# Altium schematic symbol library jlcpcb_2025_04_capacitors_extended_1206.schlib: 2503 symbols (part 4 of 14) (continued)
## C1206C104K5RACAUTO
designator C?  Capacitance: 100nF  (hidden comment: *)
Capacitor, Ceramic (MLCC), 100nF, ±10%, 50V, X7R, ±10%, SMD 1206; Manufacturer: KEMET; Manufacturer Part Number: C1206C104K5RACAUTO; Package Size: 1206; JLCPCB Basic Part: No; JLCPCB Part Number: C2178599; Supplier 1: LCSC; Category: Capacitors - MLCC; Supplier Part Number 1: C2178599; Tolerance: ±10%; Voltage Rating: 50V; Temperature Coefficient: X7R; RoHS: Yes; ComponentLink1Description: Datasheet; ComponentLink1URL: https://wmsc.lcsc.com/wmsc/upload/file/pdf/v2/lcsc/2304140030_KEMET-C1206C104K5RACAUTO_C2178599.pdf; ComponentLink2Description: JLCPCB Part URL; ComponentLink2URL: https://jlcpcb.com/partdetail/C2178599; ComponentLink3Description: LCSC Part URL; ComponentLink3URL: https://lcsc.com/product-detail/Multilayer-Ceramic-Capacitors-MLCC---SMD-SMT_KEMET-KEMET-C1206C104K5RACAUTO_C2178599.html
footprint CAP-1206 (1206 (3216M) Capacitor)
pins: 1, 2

## C1206C104KARAC7800
designator C?  Capacitance: 100nF  (hidden comment: *)
Capacitor, Ceramic (MLCC), 100nF, ±10%, 250V, X7R, ±10%, SMD 1206; Manufacturer: KEMET; Manufacturer Part Number: C1206C104KARAC7800; Package Size: 1206; JLCPCB Basic Part: No; JLCPCB Part Number: C141185; Supplier 1: LCSC; Category: Capacitors - MLCC; Supplier Part Number 1: C141185; Tolerance: ±10%; Voltage Rating: 250V; Temperature Coefficient: X7R; RoHS: Yes; ComponentLink1Description: Datasheet; ComponentLink1URL: https://wmsc.lcsc.com/wmsc/upload/file/pdf/v2/lcsc/2304140030_KEMET-C1206C104KARAC7800_C141185.pdf; ComponentLink2Description: JLCPCB Part URL; ComponentLink2URL: https://jlcpcb.com/partdetail/C141185; ComponentLink3Description: LCSC Part URL; ComponentLink3URL: https://lcsc.com/product-detail/Multilayer-Ceramic-Capacitors-MLCC---SMD-SMT_KEMET-KEMET-C1206C104KARAC7800_C141185.html
footprint CAP-1206 (1206 (3216M) Capacitor)
pins: 1, 2

## C1206C105K1RACAUTO
designator C?  Capacitance: 1uF  (hidden comment: *)
Capacitor, Ceramic (MLCC), 1uF, ±10%, 100V, X7R, ±10%, SMD 1206; Manufacturer: KEMET; Manufacturer Part Number: C1206C105K1RACAUTO; Package Size: 1206; JLCPCB Basic Part: No; JLCPCB Part Number: C696372; Supplier 1: LCSC; Category: Capacitors - MLCC; Supplier Part Number 1: C696372; Tolerance: ±10%; Voltage Rating: 100V; Temperature Coefficient: X7R; RoHS: Yes; ComponentLink1Description: Datasheet; ComponentLink1URL: https://wmsc.lcsc.com/wmsc/upload/file/pdf/v2/lcsc/2401181721_KEMET-C1206C105K1RACAUTO_C696372.pdf; ComponentLink2Description: JLCPCB Part URL; ComponentLink2URL: https://jlcpcb.com/partdetail/C696372; ComponentLink3Description: LCSC Part URL; ComponentLink3URL: https://lcsc.com/product-detail/Multilayer-Ceramic-Capacitors-MLCC---SMD-SMT_KEMET-KEMET-C1206C105K1RACAUTO_C696372.html
footprint CAP-1206 (1206 (3216M) Capacitor)
pins: 1, 2

## C1206C105K4RAC7800
designator C?  Capacitance: 1uF  (hidden comment: *)
Capacitor, Ceramic (MLCC), 1uF, ±10%, 16V, X7R, ±10%, SMD 1206; Manufacturer: KEMET; Manufacturer Part Number: C1206C105K4RAC7800; Package Size: 1206; JLCPCB Basic Part: No; JLCPCB Part Number: C696374; Supplier 1: LCSC; Category: Capacitors - MLCC; Supplier Part Number 1: C696374; Tolerance: ±10%; Voltage Rating: 16V; Temperature Coefficient: X7R; RoHS: Yes; ComponentLink1Description: Datasheet; ComponentLink1URL: https://wmsc.lcsc.com/wmsc/upload/file/pdf/v2/lcsc/2304140030_KEMET-C1206C105K4RAC7800_C696374.pdf; ComponentLink2Description: JLCPCB Part URL; ComponentLink2URL: https://jlcpcb.com/partdetail/C696374; ComponentLink3Description: LCSC Part URL; ComponentLink3URL: https://lcsc.com/product-detail/Multilayer-Ceramic-Capacitors-MLCC---SMD-SMT_KEMET-KEMET-C1206C105K4RAC7800_C696374.html
footprint CAP-1206 (1206 (3216M) Capacitor)
pins: 1, 2

## C1206C105K4RACTU
designator C?  Capacitance: 1uF  (hidden comment: *)
Capacitor, Ceramic (MLCC), 1uF, ±10%, 16V, X7R, ±10%, SMD 1206; Manufacturer: KEMET; Manufacturer Part Number: C1206C105K4RACTU; Package Size: 1206; JLCPCB Basic Part: No; JLCPCB Part Number: C2167419; Supplier 1: LCSC; Category: Capacitors - MLCC; Supplier Part Number 1: C2167419; Tolerance: ±10%; Voltage Rating: 16V; Temperature Coefficient: X7R; RoHS: Yes; ComponentLink1Description: Datasheet; ComponentLink1URL: https://wmsc.lcsc.com/wmsc/upload/file/pdf/v2/lcsc/2304140030_KEMET-C1206C105K4RACTU_C2167419.pdf; ComponentLink2Description: JLCPCB Part URL; ComponentLink2URL: https://jlcpcb.com/partdetail/C2167419; ComponentLink3Description: LCSC Part URL; ComponentLink3URL: https://lcsc.com/product-detail/Multilayer-Ceramic-Capacitors-MLCC---SMD-SMT_KEMET-KEMET-C1206C105K4RACTU_C2167419.html
footprint CAP-1206 (1206 (3216M) Capacitor)
pins: 1, 2

## C1206C105M4RAC7800
designator C?  Capacitance: 1uF  (hidden comment: *)
Capacitor, Ceramic (MLCC), 1uF, ±20%, 16V, X7R, ±20%, SMD 1206; Manufacturer: KEMET; Manufacturer Part Number: C1206C105M4RAC7800; Package Size: 1206; JLCPCB Basic Part: No; JLCPCB Part Number: C141188; Supplier 1: LCSC; Category: Capacitors - MLCC; Supplier Part Number 1: C141188; Tolerance: ±20%; Voltage Rating: 16V; Temperature Coefficient: X7R; RoHS: Yes; ComponentLink1Description: Datasheet; ComponentLink1URL: https://wmsc.lcsc.com/wmsc/upload/file/pdf/v2/lcsc/2304140030_KEMET-C1206C105M4RAC7800_C141188.pdf; ComponentLink2Description: JLCPCB Part URL; ComponentLink2URL: https://jlcpcb.com/partdetail/C141188; ComponentLink3Description: LCSC Part URL; ComponentLink3URL: https://lcsc.com/product-detail/Multilayer-Ceramic-Capacitors-MLCC---SMD-SMT_KEMET-KEMET-C1206C105M4RAC7800_C141188.html
footprint CAP-1206 (1206 (3216M) Capacitor)
pins: 1, 2

## C1206C106J3RACAUTO
designator C?  Capacitance: 10uF  (hidden comment: *)
Capacitor, Ceramic (MLCC), 10uF, ±5%, 25V, X7R, ±5%, SMD 1206; Manufacturer: KEMET; Manufacturer Part Number: C1206C106J3RACAUTO; Package Size: 1206; JLCPCB Basic Part: No; JLCPCB Part Number: C696375; Supplier 1: LCSC; Category: Capacitors - MLCC; Supplier Part Number 1: C696375; Tolerance: ±5%; Voltage Rating: 25V; Temperature Coefficient: X7R; RoHS: Yes; ComponentLink1Description: Datasheet; ComponentLink1URL: https://wmsc.lcsc.com/wmsc/upload/file/pdf/v2/lcsc/2304140030_KEMET-C1206C106J3RACAUTO_C696375.pdf; ComponentLink2Description: JLCPCB Part URL; ComponentLink2URL: https://jlcpcb.com/partdetail/C696375; ComponentLink3Description: LCSC Part URL; ComponentLink3URL: https://lcsc.com/product-detail/Multilayer-Ceramic-Capacitors-MLCC---SMD-SMT_KEMET-KEMET-C1206C106J3RACAUTO_C696375.html
footprint CAP-1206 (1206 (3216M) Capacitor)
pins: 1, 2

## C1206C106K3PAC7800
designator C?  Capacitance: 10uF  (hidden comment: *)
Capacitor, Ceramic (MLCC), 10uF, ±10%, 25V, X5R, ±10%, SMD 1206; Manufacturer: KEMET; Manufacturer Part Number: C1206C106K3PAC7800; Package Size: 1206; JLCPCB Basic Part: No; JLCPCB Part Number: C141040; Supplier 1: LCSC; Category: Capacitors - MLCC; Supplier Part Number 1: C141040; Tolerance: ±10%; Voltage Rating: 25V; Temperature Coefficient: X5R; RoHS: Yes; ComponentLink1Description: Datasheet; ComponentLink1URL: https://wmsc.lcsc.com/wmsc/upload/file/pdf/v2/lcsc/1809031511_KEMET-C1206C106K3PAC7800_C141040.pdf; ComponentLink2Description: JLCPCB Part URL; ComponentLink2URL: https://jlcpcb.com/partdetail/C141040; ComponentLink3Description: LCSC Part URL; ComponentLink3URL: https://lcsc.com/product-detail/Multilayer-Ceramic-Capacitors-MLCC---SMD-SMT_KEMET-KEMET-C1206C106K3PAC7800_C141040.html
footprint CAP-1206 (1206 (3216M) Capacitor)
pins: 1, 2

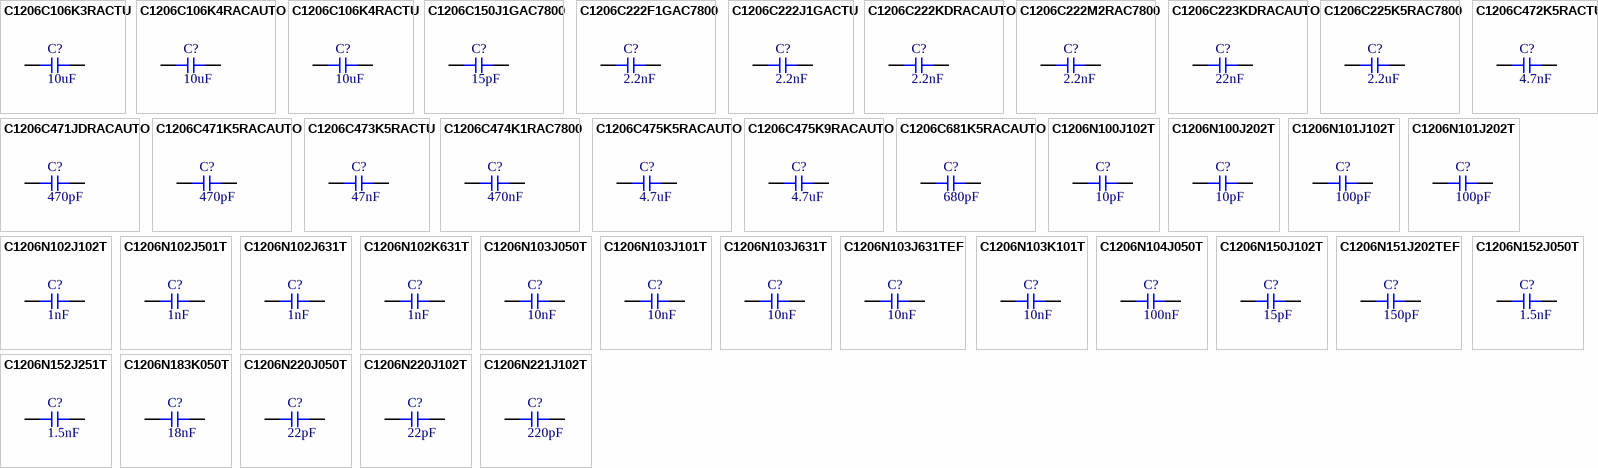
[diagram p16: symbols C1206C106K3RACTU to C1206N221J102T]

## C1206C106K3RACTU
designator C?  Capacitance: 10uF  (hidden comment: *)
Capacitor, Ceramic (MLCC), 10uF, ±10%, 25V, X7R, ±10%, SMD 1206; Manufacturer: KEMET; Manufacturer Part Number: C1206C106K3RACTU; Package Size: 1206; JLCPCB Basic Part: No; JLCPCB Part Number: C2168111; Supplier 1: LCSC; Category: Capacitors - MLCC; Supplier Part Number 1: C2168111; Tolerance: ±10%; Voltage Rating: 25V; Temperature Coefficient: X7R; RoHS: Yes; ComponentLink1Description: Datasheet; ComponentLink1URL: https://wmsc.lcsc.com/wmsc/upload/file/pdf/v2/lcsc/2304140030_KEMET-C1206C106K3RACTU_C2168111.pdf; ComponentLink2Description: JLCPCB Part URL; ComponentLink2URL: https://jlcpcb.com/partdetail/C2168111; ComponentLink3Description: LCSC Part URL; ComponentLink3URL: https://lcsc.com/product-detail/Multilayer-Ceramic-Capacitors-MLCC---SMD-SMT_KEMET-KEMET-C1206C106K3RACTU_C2168111.html
footprint CAP-1206 (1206 (3216M) Capacitor)
pins: 1, 2

## C1206C106K4RACAUTO
designator C?  Capacitance: 10uF  (hidden comment: *)
Capacitor, Ceramic (MLCC), 10uF, ±10%, 16V, X7R, ±10%, SMD 1206; Manufacturer: KEMET; Manufacturer Part Number: C1206C106K4RACAUTO; Package Size: 1206; JLCPCB Basic Part: No; JLCPCB Part Number: C141190; Supplier 1: LCSC; Category: Capacitors - MLCC; Supplier Part Number 1: C141190; Tolerance: ±10%; Voltage Rating: 16V; Temperature Coefficient: X7R; RoHS: Yes; ComponentLink1Description: Datasheet; ComponentLink1URL: https://wmsc.lcsc.com/wmsc/upload/file/pdf/v2/lcsc/2304140030_KEMET-C1206C106K4RACAUTO_C141190.pdf; ComponentLink2Description: JLCPCB Part URL; ComponentLink2URL: https://jlcpcb.com/partdetail/C141190; ComponentLink3Description: LCSC Part URL; ComponentLink3URL: https://lcsc.com/product-detail/Multilayer-Ceramic-Capacitors-MLCC---SMD-SMT_KEMET-KEMET-C1206C106K4RACAUTO_C141190.html
footprint CAP-1206 (1206 (3216M) Capacitor)
pins: 1, 2

## C1206C106K4RACTU
designator C?  Capacitance: 10uF  (hidden comment: *)
Capacitor, Ceramic (MLCC), 10uF, ±10%, 16V, X7R, ±10%, SMD 1206; Manufacturer: KEMET; Manufacturer Part Number: C1206C106K4RACTU; Package Size: 1206; JLCPCB Basic Part: No; JLCPCB Part Number: C2174822; Supplier 1: LCSC; Category: Capacitors - MLCC; Supplier Part Number 1: C2174822; Tolerance: ±10%; Voltage Rating: 16V; Temperature Coefficient: X7R; RoHS: Yes; ComponentLink1Description: Datasheet; ComponentLink1URL: https://wmsc.lcsc.com/wmsc/upload/file/pdf/v2/lcsc/2304140030_KEMET-C1206C106K4RACTU_C2174822.pdf; ComponentLink2Description: JLCPCB Part URL; ComponentLink2URL: https://jlcpcb.com/partdetail/C2174822; ComponentLink3Description: LCSC Part URL; ComponentLink3URL: https://lcsc.com/product-detail/Multilayer-Ceramic-Capacitors-MLCC---SMD-SMT_KEMET-KEMET-C1206C106K4RACTU_C2174822.html
footprint CAP-1206 (1206 (3216M) Capacitor)
pins: 1, 2

## C1206C150J1GAC7800
designator C?  Capacitance: 15pF  (hidden comment: *)
Capacitor, Ceramic (MLCC), 15pF, ±5%, 100V, C0G, ±5%, SMD 1206; Manufacturer: KEMET; Manufacturer Part Number: C1206C150J1GAC7800; Package Size: 1206; JLCPCB Basic Part: No; JLCPCB Part Number: C600023; Supplier 1: LCSC; Category: Capacitors - MLCC; Supplier Part Number 1: C600023; Tolerance: ±5%; Voltage Rating: 100V; Temperature Coefficient: C0G; RoHS: Yes; ComponentLink1Description: Datasheet; ComponentLink1URL: https://wmsc.lcsc.com/wmsc/upload/file/pdf/v2/lcsc/2006182219_KEMET-C1206C150J1GAC7800_C600023.pdf; ComponentLink2Description: JLCPCB Part URL; ComponentLink2URL: https://jlcpcb.com/partdetail/C600023; ComponentLink3Description: LCSC Part URL; ComponentLink3URL: https://lcsc.com/product-detail/Multilayer-Ceramic-Capacitors-MLCC---SMD-SMT_KEMET-KEMET-C1206C150J1GAC7800_C600023.html
footprint CAP-1206 (1206 (3216M) Capacitor)
pins: 1, 2

## C1206C222F1GAC7800
designator C?  Capacitance: 2.2nF  (hidden comment: *)
Capacitor, Ceramic (MLCC), 2.2nF, ±1%, 100V, C0G, ±1%, SMD 1206; Manufacturer: KEMET; Manufacturer Part Number: C1206C222F1GAC7800; Package Size: 1206; JLCPCB Basic Part: No; JLCPCB Part Number: C3888960; Supplier 1: LCSC; Category: Capacitors - MLCC; Supplier Part Number 1: C3888960; Tolerance: ±1%; Voltage Rating: 100V; Temperature Coefficient: C0G; RoHS: Yes; ComponentLink1Description: Datasheet; ComponentLink1URL: https://wmsc.lcsc.com/wmsc/upload/file/pdf/v2/lcsc/2401181607_KEMET-C1206C222F1GAC7800_C3888960.pdf; ComponentLink2Description: JLCPCB Part URL; ComponentLink2URL: https://jlcpcb.com/partdetail/C3888960; ComponentLink3Description: LCSC Part URL; ComponentLink3URL: https://lcsc.com/product-detail/Multilayer-Ceramic-Capacitors-MLCC---SMD-SMT_KEMET-KEMET-C1206C222F1GAC7800_C3888960.html
footprint CAP-1206 (1206 (3216M) Capacitor)
pins: 1, 2

## C1206C222J1GACTU
designator C?  Capacitance: 2.2nF  (hidden comment: *)
Capacitor, Ceramic (MLCC), 2.2nF, ±5%, 100V, C0G, ±5%, SMD 1206; Manufacturer: KEMET; Manufacturer Part Number: C1206C222J1GACTU; Package Size: 1206; JLCPCB Basic Part: No; JLCPCB Part Number: C2170897; Supplier 1: LCSC; Category: Capacitors - MLCC; Supplier Part Number 1: C2170897; Tolerance: ±5%; Voltage Rating: 100V; Temperature Coefficient: C0G; RoHS: Yes; ComponentLink1Description: Datasheet; ComponentLink1URL: https://wmsc.lcsc.com/wmsc/upload/file/pdf/v2/lcsc/2304140030_KEMET-C1206C222J1GACTU_C2170897.pdf; ComponentLink2Description: JLCPCB Part URL; ComponentLink2URL: https://jlcpcb.com/partdetail/C2170897; ComponentLink3Description: LCSC Part URL; ComponentLink3URL: https://lcsc.com/product-detail/Multilayer-Ceramic-Capacitors-MLCC---SMD-SMT_KEMET-KEMET-C1206C222J1GACTU_C2170897.html
footprint CAP-1206 (1206 (3216M) Capacitor)
pins: 1, 2

## C1206C222KDRACAUTO
designator C?  Capacitance: 2.2nF  (hidden comment: *)
Capacitor, Ceramic (MLCC), 2.2nF, ±10%, 1kV, X7R, ±10%, SMD 1206; Manufacturer: KEMET; Manufacturer Part Number: C1206C222KDRACAUTO; Package Size: 1206; JLCPCB Basic Part: No; JLCPCB Part Number: C129671; Supplier 1: LCSC; Category: Capacitors - MLCC; Supplier Part Number 1: C129671; Tolerance: ±10%; Voltage Rating: 1kV; Temperature Coefficient: X7R; RoHS: Yes; ComponentLink1Description: Datasheet; ComponentLink1URL: https://wmsc.lcsc.com/wmsc/upload/file/pdf/v2/lcsc/2304140030_KEMET-C1206C222KDRACAUTO_C129671.pdf; ComponentLink2Description: JLCPCB Part URL; ComponentLink2URL: https://jlcpcb.com/partdetail/C129671; ComponentLink3Description: LCSC Part URL; ComponentLink3URL: https://lcsc.com/product-detail/Multilayer-Ceramic-Capacitors-MLCC---SMD-SMT_KEMET-KEMET-C1206C222KDRACAUTO_C129671.html
footprint CAP-1206 (1206 (3216M) Capacitor)
pins: 1, 2

## C1206C222M2RAC7800
designator C?  Capacitance: 2.2nF  (hidden comment: *)
Capacitor, Ceramic (MLCC), 2.2nF, ±20%, 200V, X7R, ±20%, SMD 1206; Manufacturer: KEMET; Manufacturer Part Number: C1206C222M2RAC7800; Package Size: 1206; JLCPCB Basic Part: No; JLCPCB Part Number: C141193; Supplier 1: LCSC; Category: Capacitors - MLCC; Supplier Part Number 1: C141193; Tolerance: ±20%; Voltage Rating: 200V; Temperature Coefficient: X7R; RoHS: Yes; ComponentLink1Description: Datasheet; ComponentLink1URL: https://wmsc.lcsc.com/wmsc/upload/file/pdf/v2/lcsc/2304140030_KEMET-C1206C222M2RAC7800_C141193.pdf; ComponentLink2Description: JLCPCB Part URL; ComponentLink2URL: https://jlcpcb.com/partdetail/C141193; ComponentLink3Description: LCSC Part URL; ComponentLink3URL: https://lcsc.com/product-detail/Multilayer-Ceramic-Capacitors-MLCC---SMD-SMT_KEMET-KEMET-C1206C222M2RAC7800_C141193.html
footprint CAP-1206 (1206 (3216M) Capacitor)
pins: 1, 2

## C1206C223KDRACAUTO
designator C?  Capacitance: 22nF  (hidden comment: *)
Capacitor, Ceramic (MLCC), 22nF, ±10%, 1kV, X7R, ±10%, SMD 1206; Manufacturer: KEMET; Manufacturer Part Number: C1206C223KDRACAUTO; Package Size: 1206; JLCPCB Basic Part: No; JLCPCB Part Number: C3888813; Supplier 1: LCSC; Category: Capacitors - MLCC; Supplier Part Number 1: C3888813; Tolerance: ±10%; Voltage Rating: 1kV; Temperature Coefficient: X7R; RoHS: Yes; ComponentLink1Description: Datasheet; ComponentLink1URL: https://wmsc.lcsc.com/wmsc/upload/file/pdf/v2/lcsc/2401181607_KEMET-C1206C223KDRACAUTO_C3888813.pdf; ComponentLink2Description: JLCPCB Part URL; ComponentLink2URL: https://jlcpcb.com/partdetail/C3888813; ComponentLink3Description: LCSC Part URL; ComponentLink3URL: https://lcsc.com/product-detail/Multilayer-Ceramic-Capacitors-MLCC---SMD-SMT_KEMET-KEMET-C1206C223KDRACAUTO_C3888813.html
footprint CAP-1206 (1206 (3216M) Capacitor)
pins: 1, 2

## C1206C225K5RAC7800
designator C?  Capacitance: 2.2uF  (hidden comment: *)
Capacitor, Ceramic (MLCC), 2.2uF, ±10%, 50V, X7R, ±10%, SMD 1206; Manufacturer: KEMET; Manufacturer Part Number: C1206C225K5RAC7800; Package Size: 1206; JLCPCB Basic Part: No; JLCPCB Part Number: C141195; Supplier 1: LCSC; Category: Capacitors - MLCC; Supplier Part Number 1: C141195; Tolerance: ±10%; Voltage Rating: 50V; Temperature Coefficient: X7R; RoHS: Yes; ComponentLink1Description: Datasheet; ComponentLink1URL: https://wmsc.lcsc.com/wmsc/upload/file/pdf/v2/lcsc/2304140030_KEMET-C1206C225K5RAC7800_C141195.pdf; ComponentLink2Description: JLCPCB Part URL; ComponentLink2URL: https://jlcpcb.com/partdetail/C141195; ComponentLink3Description: LCSC Part URL; ComponentLink3URL: https://lcsc.com/product-detail/Multilayer-Ceramic-Capacitors-MLCC---SMD-SMT_KEMET-KEMET-C1206C225K5RAC7800_C141195.html
footprint CAP-1206 (1206 (3216M) Capacitor)
pins: 1, 2

## C1206C471JDRACAUTO
designator C?  Capacitance: 470pF  (hidden comment: *)
Capacitor, Ceramic (MLCC), 470pF, ±5%, 1kV, X7R, ±5%, SMD 1206; Manufacturer: KEMET; Manufacturer Part Number: C1206C471JDRACAUTO; Package Size: 1206; JLCPCB Basic Part: No; JLCPCB Part Number: C129672; Supplier 1: LCSC; Category: Capacitors - MLCC; Supplier Part Number 1: C129672; Tolerance: ±5%; Voltage Rating: 1kV; Temperature Coefficient: X7R; RoHS: Yes; ComponentLink1Description: Datasheet; ComponentLink1URL: https://wmsc.lcsc.com/wmsc/upload/file/pdf/v2/lcsc/2304140030_KEMET-C1206C471JDRACAUTO_C129672.pdf; ComponentLink2Description: JLCPCB Part URL; ComponentLink2URL: https://jlcpcb.com/partdetail/C129672; ComponentLink3Description: LCSC Part URL; ComponentLink3URL: https://lcsc.com/product-detail/Multilayer-Ceramic-Capacitors-MLCC---SMD-SMT_KEMET-KEMET-C1206C471JDRACAUTO_C129672.html
footprint CAP-1206 (1206 (3216M) Capacitor)
pins: 1, 2

## C1206C471K5RACAUTO
designator C?  Capacitance: 470pF  (hidden comment: *)
Capacitor, Ceramic (MLCC), 470pF, ±10%, 50V, X7R, ±10%, SMD 1206; Manufacturer: KEMET; Manufacturer Part Number: C1206C471K5RACAUTO; Package Size: 1206; JLCPCB Basic Part: No; JLCPCB Part Number: C129673; Supplier 1: LCSC; Category: Capacitors - MLCC; Supplier Part Number 1: C129673; Tolerance: ±10%; Voltage Rating: 50V; Temperature Coefficient: X7R; RoHS: Yes; ComponentLink1Description: Datasheet; ComponentLink1URL: https://wmsc.lcsc.com/wmsc/upload/file/pdf/v2/lcsc/2304140030_KEMET-C1206C471K5RACAUTO_C129673.pdf; ComponentLink2Description: JLCPCB Part URL; ComponentLink2URL: https://jlcpcb.com/partdetail/C129673; ComponentLink3Description: LCSC Part URL; ComponentLink3URL: https://lcsc.com/product-detail/Multilayer-Ceramic-Capacitors-MLCC---SMD-SMT_KEMET-KEMET-C1206C471K5RACAUTO_C129673.html
footprint CAP-1206 (1206 (3216M) Capacitor)
pins: 1, 2

## C1206C472K5RACTU
designator C?  Capacitance: 4.7nF  (hidden comment: *)
Capacitor, Ceramic (MLCC), 4.7nF, ±10%, 50V, X7R, ±10%, SMD 1206; Manufacturer: KEMET; Manufacturer Part Number: C1206C472K5RACTU; Package Size: 1206; JLCPCB Basic Part: No; JLCPCB Part Number: C452756; Supplier 1: LCSC; Category: Capacitors - MLCC; Supplier Part Number 1: C452756; Tolerance: ±10%; Voltage Rating: 50V; Temperature Coefficient: X7R; RoHS: Yes; ComponentLink1Description: Datasheet; ComponentLink1URL: https://wmsc.lcsc.com/wmsc/upload/file/pdf/v2/lcsc/2304140030_KEMET-C1206C472K5RACTU_C452756.pdf; ComponentLink2Description: JLCPCB Part URL; ComponentLink2URL: https://jlcpcb.com/partdetail/C452756; ComponentLink3Description: LCSC Part URL; ComponentLink3URL: https://lcsc.com/product-detail/Multilayer-Ceramic-Capacitors-MLCC---SMD-SMT_KEMET-KEMET-C1206C472K5RACTU_C452756.html
footprint CAP-1206 (1206 (3216M) Capacitor)
pins: 1, 2

## C1206C473K5RACTU
designator C?  Capacitance: 47nF  (hidden comment: *)
Capacitor, Ceramic (MLCC), 47nF, ±10%, 50V, X7R, ±10%, SMD 1206; Manufacturer: KEMET; Manufacturer Part Number: C1206C473K5RACTU; Package Size: 1206; JLCPCB Basic Part: No; JLCPCB Part Number: C452757; Supplier 1: LCSC; Category: Capacitors - MLCC; Supplier Part Number 1: C452757; Tolerance: ±10%; Voltage Rating: 50V; Temperature Coefficient: X7R; RoHS: Yes; ComponentLink1Description: Datasheet; ComponentLink1URL: https://wmsc.lcsc.com/wmsc/upload/file/pdf/v2/lcsc/2304140030_KEMET-C1206C473K5RACTU_C452757.pdf; ComponentLink2Description: JLCPCB Part URL; ComponentLink2URL: https://jlcpcb.com/partdetail/C452757; ComponentLink3Description: LCSC Part URL; ComponentLink3URL: https://lcsc.com/product-detail/Multilayer-Ceramic-Capacitors-MLCC---SMD-SMT_KEMET-KEMET-C1206C473K5RACTU_C452757.html
footprint CAP-1206 (1206 (3216M) Capacitor)
pins: 1, 2

## C1206C474K1RAC7800
designator C?  Capacitance: 470nF  (hidden comment: *)
Capacitor, Ceramic (MLCC), 470nF, ±10%, 100V, X7R, ±10%, SMD 1206; Manufacturer: KEMET; Manufacturer Part Number: C1206C474K1RAC7800; Package Size: 1206; JLCPCB Basic Part: No; JLCPCB Part Number: C141200; Supplier 1: LCSC; Category: Capacitors - MLCC; Supplier Part Number 1: C141200; Tolerance: ±10%; Voltage Rating: 100V; Temperature Coefficient: X7R; RoHS: Yes; ComponentLink1Description: Datasheet; ComponentLink1URL: https://wmsc.lcsc.com/wmsc/upload/file/pdf/v2/lcsc/2304140030_KEMET-C1206C474K1RAC7800_C141200.pdf; ComponentLink2Description: JLCPCB Part URL; ComponentLink2URL: https://jlcpcb.com/partdetail/C141200; ComponentLink3Description: LCSC Part URL; ComponentLink3URL: https://lcsc.com/product-detail/Multilayer-Ceramic-Capacitors-MLCC---SMD-SMT_KEMET-KEMET-C1206C474K1RAC7800_C141200.html
footprint CAP-1206 (1206 (3216M) Capacitor)
pins: 1, 2

## C1206C475K5RACAUTO
designator C?  Capacitance: 4.7uF  (hidden comment: *)
Capacitor, Ceramic (MLCC), 4.7uF, ±10%, 50V, X7R, ±10%, SMD 1206; Manufacturer: KEMET; Manufacturer Part Number: C1206C475K5RACAUTO; Package Size: 1206; JLCPCB Basic Part: No; JLCPCB Part Number: C696377; Supplier 1: LCSC; Category: Capacitors - MLCC; Supplier Part Number 1: C696377; Tolerance: ±10%; Voltage Rating: 50V; Temperature Coefficient: X7R; RoHS: Yes; ComponentLink1Description: Datasheet; ComponentLink1URL: https://wmsc.lcsc.com/wmsc/upload/file/pdf/v2/lcsc/2304251426_KEMET-C1206C475K5RACAUTO_C696377.pdf; ComponentLink2Description: JLCPCB Part URL; ComponentLink2URL: https://jlcpcb.com/partdetail/C696377; ComponentLink3Description: LCSC Part URL; ComponentLink3URL: https://lcsc.com/product-detail/Multilayer-Ceramic-Capacitors-MLCC---SMD-SMT_KEMET-KEMET-C1206C475K5RACAUTO_C696377.html
footprint CAP-1206 (1206 (3216M) Capacitor)
pins: 1, 2

## C1206C475K9RACAUTO
designator C?  Capacitance: 4.7uF  (hidden comment: *)
Capacitor, Ceramic (MLCC), 4.7uF, ±10%, 6.3V, X7R, ±10%, SMD 1206; Manufacturer: KEMET; Manufacturer Part Number: C1206C475K9RACAUTO; Package Size: 1206; JLCPCB Basic Part: No; JLCPCB Part Number: C141204; Supplier 1: LCSC; Category: Capacitors - MLCC; Supplier Part Number 1: C141204; Tolerance: ±10%; Voltage Rating: 6.3V; Temperature Coefficient: X7R; RoHS: Yes; ComponentLink1Description: Datasheet; ComponentLink1URL: https://wmsc.lcsc.com/wmsc/upload/file/pdf/v2/lcsc/2304140030_KEMET-C1206C475K9RACAUTO_C141204.pdf; ComponentLink2Description: JLCPCB Part URL; ComponentLink2URL: https://jlcpcb.com/partdetail/C141204; ComponentLink3Description: LCSC Part URL; ComponentLink3URL: https://lcsc.com/product-detail/Multilayer-Ceramic-Capacitors-MLCC---SMD-SMT_KEMET-KEMET-C1206C475K9RACAUTO_C141204.html
footprint CAP-1206 (1206 (3216M) Capacitor)
pins: 1, 2

## C1206C681K5RACAUTO
designator C?  Capacitance: 680pF  (hidden comment: *)
Capacitor, Ceramic (MLCC), 680pF, ±10%, 50V, X7R, ±10%, SMD 1206; Manufacturer: KEMET; Manufacturer Part Number: C1206C681K5RACAUTO; Package Size: 1206; JLCPCB Basic Part: No; JLCPCB Part Number: C129675; Supplier 1: LCSC; Category: Capacitors - MLCC; Supplier Part Number 1: C129675; Tolerance: ±10%; Voltage Rating: 50V; Temperature Coefficient: X7R; RoHS: Yes; ComponentLink1Description: Datasheet; ComponentLink1URL: https://wmsc.lcsc.com/wmsc/upload/file/pdf/v2/lcsc/2304140030_KEMET-C1206C681K5RACAUTO_C129675.pdf; ComponentLink2Description: JLCPCB Part URL; ComponentLink2URL: https://jlcpcb.com/partdetail/C129675; ComponentLink3Description: LCSC Part URL; ComponentLink3URL: https://lcsc.com/product-detail/Multilayer-Ceramic-Capacitors-MLCC---SMD-SMT_KEMET-KEMET-C1206C681K5RACAUTO_C129675.html
footprint CAP-1206 (1206 (3216M) Capacitor)
pins: 1, 2

## C1206N100J102T
designator C?  Capacitance: 10pF  (hidden comment: *)
Capacitor, Ceramic (MLCC), 10pF, ±5%, 1kV, C0G, ±5%, SMD 1206; Manufacturer: IHHEC(HOLY STONE ENTERPRISE CO., LTD); Manufacturer Part Number: C1206N100J102T; Package Size: 1206; JLCPCB Basic Part: No; JLCPCB Part Number: C105961; Supplier 1: LCSC; Category: Capacitors - MLCC; Supplier Part Number 1: C105961; Tolerance: ±5%; Voltage Rating: 1kV; Temperature Coefficient: C0G; RoHS: Yes; ComponentLink1Description: Datasheet; ComponentLink1URL: https://wmsc.lcsc.com/wmsc/upload/file/pdf/v2/lcsc/2304140030_IHHEC-HOLY-STONE-ENTERPRISE-CO---LTD-C1206N100J102T_C105961.pdf; ComponentLink2Description: JLCPCB Part URL; ComponentLink2URL: https://jlcpcb.com/partdetail/C105961; ComponentLink3Description: LCSC Part URL; ComponentLink3URL: https://lcsc.com/product-detail/Multilayer-Ceramic-Capacitors-MLCC---SMD-SMT_IHHECHOLY-STONE-ENTERPRISE-CO.%2C-LTD-IHHECHOLY-STONE-ENTERPRISE-CO.%2C-LTD-C1206N100J102T_C105961.html
footprint CAP-1206 (1206 (3216M) Capacitor)
pins: 1, 2

## C1206N100J202T
designator C?  Capacitance: 10pF  (hidden comment: *)
Capacitor, Ceramic (MLCC), 10pF, ±5%, 2kV, C0G, ±5%, SMD 1206; Manufacturer: IHHEC(HOLY STONE ENTERPRISE CO., LTD); Manufacturer Part Number: C1206N100J202T; Package Size: 1206; JLCPCB Basic Part: No; JLCPCB Part Number: C105962; Supplier 1: LCSC; Category: Capacitors - MLCC; Supplier Part Number 1: C105962; Tolerance: ±5%; Voltage Rating: 2kV; Temperature Coefficient: C0G; RoHS: Yes; ComponentLink1Description: Datasheet; ComponentLink1URL: https://wmsc.lcsc.com/wmsc/upload/file/pdf/v2/lcsc/2304140030_IHHEC-HOLY-STONE-ENTERPRISE-CO---LTD-C1206N100J202T_C105962.pdf; ComponentLink2Description: JLCPCB Part URL; ComponentLink2URL: https://jlcpcb.com/partdetail/C105962; ComponentLink3Description: LCSC Part URL; ComponentLink3URL: https://lcsc.com/product-detail/Multilayer-Ceramic-Capacitors-MLCC---SMD-SMT_IHHECHOLY-STONE-ENTERPRISE-CO.%2C-LTD-IHHECHOLY-STONE-ENTERPRISE-CO.%2C-LTD-C1206N100J202T_C105962.html
footprint CAP-1206 (1206 (3216M) Capacitor)
pins: 1, 2

## C1206N101J102T
designator C?  Capacitance: 100pF  (hidden comment: *)
Capacitor, Ceramic (MLCC), 100pF, ±5%, 1kV, C0G, ±5%, SMD 1206; Manufacturer: IHHEC(HOLY STONE ENTERPRISE CO., LTD); Manufacturer Part Number: C1206N101J102T; Package Size: 1206; JLCPCB Basic Part: No; JLCPCB Part Number: C105963; Supplier 1: LCSC; Category: Capacitors - MLCC; Supplier Part Number 1: C105963; Tolerance: ±5%; Voltage Rating: 1kV; Temperature Coefficient: C0G; RoHS: Yes; ComponentLink1Description: Datasheet; ComponentLink1URL: https://wmsc.lcsc.com/wmsc/upload/file/pdf/v2/lcsc/2304140030_IHHEC-HOLY-STONE-ENTERPRISE-CO---LTD-C1206N101J102T_C105963.pdf; ComponentLink2Description: JLCPCB Part URL; ComponentLink2URL: https://jlcpcb.com/partdetail/C105963; ComponentLink3Description: LCSC Part URL; ComponentLink3URL: https://lcsc.com/product-detail/Multilayer-Ceramic-Capacitors-MLCC---SMD-SMT_IHHECHOLY-STONE-ENTERPRISE-CO.%2C-LTD-IHHECHOLY-STONE-ENTERPRISE-CO.%2C-LTD-C1206N101J102T_C105963.html
footprint CAP-1206 (1206 (3216M) Capacitor)
pins: 1, 2

## C1206N101J202T
designator C?  Capacitance: 100pF  (hidden comment: *)
Capacitor, Ceramic (MLCC), 100pF, ±5%, 2kV, C0G, ±5%, SMD 1206; Manufacturer: IHHEC(HOLY STONE ENTERPRISE CO., LTD); Manufacturer Part Number: C1206N101J202T; Package Size: 1206; JLCPCB Basic Part: No; JLCPCB Part Number: C105964; Supplier 1: LCSC; Category: Capacitors - MLCC; Supplier Part Number 1: C105964; Tolerance: ±5%; Voltage Rating: 2kV; Temperature Coefficient: C0G; RoHS: Yes; ComponentLink1Description: Datasheet; ComponentLink1URL: https://wmsc.lcsc.com/wmsc/upload/file/pdf/v2/lcsc/2304140030_IHHEC-HOLY-STONE-ENTERPRISE-CO---LTD-C1206N101J202T_C105964.pdf; ComponentLink2Description: JLCPCB Part URL; ComponentLink2URL: https://jlcpcb.com/partdetail/C105964; ComponentLink3Description: LCSC Part URL; ComponentLink3URL: https://lcsc.com/product-detail/Multilayer-Ceramic-Capacitors-MLCC---SMD-SMT_IHHECHOLY-STONE-ENTERPRISE-CO.%2C-LTD-IHHECHOLY-STONE-ENTERPRISE-CO.%2C-LTD-C1206N101J202T_C105964.html
footprint CAP-1206 (1206 (3216M) Capacitor)
pins: 1, 2

## C1206N102J102T
designator C?  Capacitance: 1nF  (hidden comment: *)
Capacitor, Ceramic (MLCC), 1nF, ±5%, 1kV, C0G, ±5%, SMD 1206; Manufacturer: IHHEC(HOLY STONE ENTERPRISE CO., LTD); Manufacturer Part Number: C1206N102J102T; Package Size: 1206; JLCPCB Basic Part: No; JLCPCB Part Number: C105965; Supplier 1: LCSC; Category: Capacitors - MLCC; Supplier Part Number 1: C105965; Tolerance: ±5%; Voltage Rating: 1kV; Temperature Coefficient: C0G; RoHS: Yes; ComponentLink1Description: Datasheet; ComponentLink1URL: https://wmsc.lcsc.com/wmsc/upload/file/pdf/v2/lcsc/2304140030_IHHEC-HOLY-STONE-ENTERPRISE-CO---LTD-C1206N102J102T_C105965.pdf; ComponentLink2Description: JLCPCB Part URL; ComponentLink2URL: https://jlcpcb.com/partdetail/C105965; ComponentLink3Description: LCSC Part URL; ComponentLink3URL: https://lcsc.com/product-detail/Multilayer-Ceramic-Capacitors-MLCC---SMD-SMT_IHHECHOLY-STONE-ENTERPRISE-CO.%2C-LTD-IHHECHOLY-STONE-ENTERPRISE-CO.%2C-LTD-C1206N102J102T_C105965.html
footprint CAP-1206 (1206 (3216M) Capacitor)
pins: 1, 2

## C1206N102J501T
designator C?  Capacitance: 1nF  (hidden comment: *)
Capacitor, Ceramic (MLCC), 1nF, ±5%, 500V, NP0, ±5%, SMD 1206; Manufacturer: IHHEC(HOLY STONE ENTERPRISE CO., LTD); Manufacturer Part Number: C1206N102J501T; Package Size: 1206; JLCPCB Basic Part: No; JLCPCB Part Number: C105966; Supplier 1: LCSC; Category: Capacitors - MLCC; Supplier Part Number 1: C105966; Tolerance: ±5%; Voltage Rating: 500V; Temperature Coefficient: NP0; RoHS: Yes; ComponentLink1Description: Datasheet; ComponentLink1URL: https://wmsc.lcsc.com/wmsc/upload/file/pdf/v2/lcsc/2304140030_IHHEC-HOLY-STONE-ENTERPRISE-CO---LTD-C1206N102J501T_C105966.pdf; ComponentLink2Description: JLCPCB Part URL; ComponentLink2URL: https://jlcpcb.com/partdetail/C105966; ComponentLink3Description: LCSC Part URL; ComponentLink3URL: https://lcsc.com/product-detail/Multilayer-Ceramic-Capacitors-MLCC---SMD-SMT_IHHECHOLY-STONE-ENTERPRISE-CO.%2C-LTD-IHHECHOLY-STONE-ENTERPRISE-CO.%2C-LTD-C1206N102J501T_C105966.html
footprint CAP-1206 (1206 (3216M) Capacitor)
pins: 1, 2

## C1206N102J631T
designator C?  Capacitance: 1nF  (hidden comment: *)
Capacitor, Ceramic (MLCC), 1nF, ±5%, 630V, NP0, ±5%, SMD 1206; Manufacturer: IHHEC(HOLY STONE ENTERPRISE CO., LTD); Manufacturer Part Number: C1206N102J631T; Package Size: 1206; JLCPCB Basic Part: No; JLCPCB Part Number: C337979; Supplier 1: LCSC; Category: Capacitors - MLCC; Supplier Part Number 1: C337979; Tolerance: ±5%; Voltage Rating: 630V; Temperature Coefficient: NP0; RoHS: Yes; ComponentLink1Description: Datasheet; ComponentLink1URL: https://wmsc.lcsc.com/wmsc/upload/file/pdf/v2/lcsc/2304140030_IHHEC-HOLY-STONE-ENTERPRISE-CO---LTD-C1206N102J631T_C337979.pdf; ComponentLink2Description: JLCPCB Part URL; ComponentLink2URL: https://jlcpcb.com/partdetail/C337979; ComponentLink3Description: LCSC Part URL; ComponentLink3URL: https://lcsc.com/product-detail/Multilayer-Ceramic-Capacitors-MLCC---SMD-SMT_IHHECHOLY-STONE-ENTERPRISE-CO.%2C-LTD-IHHECHOLY-STONE-ENTERPRISE-CO.%2C-LTD-C1206N102J631T_C337979.html
footprint CAP-1206 (1206 (3216M) Capacitor)
pins: 1, 2

## C1206N102K631T
designator C?  Capacitance: 1nF  (hidden comment: *)
Capacitor, Ceramic (MLCC), 1nF, ±10%, 630V, NP0, ±10%, SMD 1206; Manufacturer: IHHEC(HOLY STONE ENTERPRISE CO., LTD); Manufacturer Part Number: C1206N102K631T; Package Size: 1206; JLCPCB Basic Part: No; JLCPCB Part Number: C2998554; Supplier 1: LCSC; Category: Capacitors - MLCC; Supplier Part Number 1: C2998554; Tolerance: ±10%; Voltage Rating: 630V; Temperature Coefficient: NP0; RoHS: Yes; ComponentLink1Description: Datasheet; ComponentLink1URL: https://wmsc.lcsc.com/wmsc/upload/file/pdf/v2/lcsc/2205051716_IHHEC-HOLY-STONE-ENTERPRISE-CO---LTD-C1206N102K631T_C2998554.pdf; ComponentLink2Description: JLCPCB Part URL; ComponentLink2URL: https://jlcpcb.com/partdetail/C2998554; ComponentLink3Description: LCSC Part URL; ComponentLink3URL: https://lcsc.com/product-detail/Multilayer-Ceramic-Capacitors-MLCC---SMD-SMT_IHHECHOLY-STONE-ENTERPRISE-CO.%2C-LTD-IHHECHOLY-STONE-ENTERPRISE-CO.%2C-LTD-C1206N102K631T_C2998554.html
footprint CAP-1206 (1206 (3216M) Capacitor)
pins: 1, 2

## C1206N103J050T
designator C?  Capacitance: 10nF  (hidden comment: *)
Capacitor, Ceramic (MLCC), 10nF, ±5%, 50V, NP0, ±5%, SMD 1206; Manufacturer: IHHEC(HOLY STONE ENTERPRISE CO., LTD); Manufacturer Part Number: C1206N103J050T; Package Size: 1206; JLCPCB Basic Part: No; JLCPCB Part Number: C105967; Supplier 1: LCSC; Category: Capacitors - MLCC; Supplier Part Number 1: C105967; Tolerance: ±5%; Voltage Rating: 50V; Temperature Coefficient: NP0; RoHS: Yes; ComponentLink1Description: Datasheet; ComponentLink1URL: https://wmsc.lcsc.com/wmsc/upload/file/pdf/v2/lcsc/2304140030_IHHEC-HOLY-STONE-ENTERPRISE-CO---LTD-C1206N103J050T_C105967.pdf; ComponentLink2Description: JLCPCB Part URL; ComponentLink2URL: https://jlcpcb.com/partdetail/C105967; ComponentLink3Description: LCSC Part URL; ComponentLink3URL: https://lcsc.com/product-detail/Multilayer-Ceramic-Capacitors-MLCC---SMD-SMT_IHHECHOLY-STONE-ENTERPRISE-CO.%2C-LTD-IHHECHOLY-STONE-ENTERPRISE-CO.%2C-LTD-C1206N103J050T_C105967.html
footprint CAP-1206 (1206 (3216M) Capacitor)
pins: 1, 2

## C1206N103J101T
designator C?  Capacitance: 10nF  (hidden comment: *)
Capacitor, Ceramic (MLCC), 10nF, ±5%, 100V, NP0, ±5%, SMD 1206; Manufacturer: IHHEC(HOLY STONE ENTERPRISE CO., LTD); Manufacturer Part Number: C1206N103J101T; Package Size: 1206; JLCPCB Basic Part: No; JLCPCB Part Number: C105968; Supplier 1: LCSC; Category: Capacitors - MLCC; Supplier Part Number 1: C105968; Tolerance: ±5%; Voltage Rating: 100V; Temperature Coefficient: NP0; RoHS: Yes; ComponentLink1Description: Datasheet; ComponentLink1URL: https://wmsc.lcsc.com/wmsc/upload/file/pdf/v2/lcsc/2304140030_IHHEC-HOLY-STONE-ENTERPRISE-CO---LTD-C1206N103J101T_C105968.pdf; ComponentLink2Description: JLCPCB Part URL; ComponentLink2URL: https://jlcpcb.com/partdetail/C105968; ComponentLink3Description: LCSC Part URL; ComponentLink3URL: https://lcsc.com/product-detail/Multilayer-Ceramic-Capacitors-MLCC---SMD-SMT_IHHECHOLY-STONE-ENTERPRISE-CO.%2C-LTD-IHHECHOLY-STONE-ENTERPRISE-CO.%2C-LTD-C1206N103J101T_C105968.html
footprint CAP-1206 (1206 (3216M) Capacitor)
pins: 1, 2

## C1206N103J631T
designator C?  Capacitance: 10nF  (hidden comment: *)
Capacitor, Ceramic (MLCC), 10nF, 630V, NP0, SMD 1206; Manufacturer: IHHEC(HOLY STONE ENTERPRISE CO., LTD); Manufacturer Part Number: C1206N103J631T; Package Size: 1206; JLCPCB Basic Part: No; JLCPCB Part Number: C2915756; Supplier 1: LCSC; Category: Capacitors - MLCC; Supplier Part Number 1: C2915756; Voltage Rating: 630V; Temperature Coefficient: NP0; RoHS: Yes; ComponentLink1Description: Datasheet; ComponentLink1URL: https://wmsc.lcsc.com/wmsc/upload/file/pdf/v2/lcsc/2111172030_IHHEC-HOLY-STONE-ENTERPRISE-CO---LTD-C1206N103J631T_C2915756.pdf; ComponentLink2Description: JLCPCB Part URL; ComponentLink2URL: https://jlcpcb.com/partdetail/C2915756; ComponentLink3Description: LCSC Part URL; ComponentLink3URL: https://lcsc.com/product-detail/Multilayer-Ceramic-Capacitors-MLCC---SMD-SMT_IHHECHOLY-STONE-ENTERPRISE-CO.%2C-LTD-IHHECHOLY-STONE-ENTERPRISE-CO.%2C-LTD-C1206N103J631T_C2915756.html
footprint CAP-1206 (1206 (3216M) Capacitor)
pins: 1, 2

## C1206N103J631TEF
designator C?  Capacitance: 10nF  (hidden comment: *)
Capacitor, Ceramic (MLCC), 10nF, ±5%, 630V, NP0, ±5%, SMD 1206; Manufacturer: IHHEC(HOLY STONE ENTERPRISE CO., LTD); Manufacturer Part Number: C1206N103J631TEF; Package Size: 1206; JLCPCB Basic Part: No; JLCPCB Part Number: C2991908; Supplier 1: LCSC; Category: Capacitors - MLCC; Supplier Part Number 1: C2991908; Tolerance: ±5%; Voltage Rating: 630V; Temperature Coefficient: NP0; RoHS: Yes; ComponentLink1Description: Datasheet; ComponentLink1URL: https://wmsc.lcsc.com/wmsc/upload/file/pdf/v2/lcsc/2204220915_IHHEC-HOLY-STONE-ENTERPRISE-CO---LTD-C1206N103J631TEF_C2991908.pdf; ComponentLink2Description: JLCPCB Part URL; ComponentLink2URL: https://jlcpcb.com/partdetail/C2991908; ComponentLink3Description: LCSC Part URL; ComponentLink3URL: https://lcsc.com/product-detail/Multilayer-Ceramic-Capacitors-MLCC---SMD-SMT_IHHECHOLY-STONE-ENTERPRISE-CO.%2C-LTD-IHHECHOLY-STONE-ENTERPRISE-CO.%2C-LTD-C1206N103J631TEF_C2991908.html
footprint CAP-1206 (1206 (3216M) Capacitor)
pins: 1, 2

## C1206N103K101T
designator C?  Capacitance: 10nF  (hidden comment: *)
Capacitor, Ceramic (MLCC), 10nF, ±10%, 100V, NP0, ±10%, SMD 1206; Manufacturer: IHHEC(HOLY STONE ENTERPRISE CO., LTD); Manufacturer Part Number: C1206N103K101T; Package Size: 1206; JLCPCB Basic Part: No; JLCPCB Part Number: C105969; Supplier 1: LCSC; Category: Capacitors - MLCC; Supplier Part Number 1: C105969; Tolerance: ±10%; Voltage Rating: 100V; Temperature Coefficient: NP0; RoHS: Yes; ComponentLink1Description: Datasheet; ComponentLink1URL: https://wmsc.lcsc.com/wmsc/upload/file/pdf/v2/lcsc/2304140030_IHHEC-HOLY-STONE-ENTERPRISE-CO---LTD-C1206N103K101T_C105969.pdf; ComponentLink2Description: JLCPCB Part URL; ComponentLink2URL: https://jlcpcb.com/partdetail/C105969; ComponentLink3Description: LCSC Part URL; ComponentLink3URL: https://lcsc.com/product-detail/Multilayer-Ceramic-Capacitors-MLCC---SMD-SMT_IHHECHOLY-STONE-ENTERPRISE-CO.%2C-LTD-IHHECHOLY-STONE-ENTERPRISE-CO.%2C-LTD-C1206N103K101T_C105969.html
footprint CAP-1206 (1206 (3216M) Capacitor)
pins: 1, 2

## C1206N104J050T
designator C?  Capacitance: 100nF  (hidden comment: *)
Capacitor, Ceramic (MLCC), 100nF, ±5%, 50V, NP0, ±5%, SMD 1206; Manufacturer: IHHEC(HOLY STONE ENTERPRISE CO., LTD); Manufacturer Part Number: C1206N104J050T; Package Size: 1206; JLCPCB Basic Part: No; JLCPCB Part Number: C105970; Supplier 1: LCSC; Category: Capacitors - MLCC; Supplier Part Number 1: C105970; Tolerance: ±5%; Voltage Rating: 50V; Temperature Coefficient: NP0; RoHS: Yes; ComponentLink1Description: Datasheet; ComponentLink1URL: https://wmsc.lcsc.com/wmsc/upload/file/pdf/v2/lcsc/2304140030_IHHEC-HOLY-STONE-ENTERPRISE-CO---LTD-C1206N104J050T_C105970.pdf; ComponentLink2Description: JLCPCB Part URL; ComponentLink2URL: https://jlcpcb.com/partdetail/C105970; ComponentLink3Description: LCSC Part URL; ComponentLink3URL: https://lcsc.com/product-detail/Multilayer-Ceramic-Capacitors-MLCC---SMD-SMT_IHHECHOLY-STONE-ENTERPRISE-CO.%2C-LTD-IHHECHOLY-STONE-ENTERPRISE-CO.%2C-LTD-C1206N104J050T_C105970.html
footprint CAP-1206 (1206 (3216M) Capacitor)
pins: 1, 2

## C1206N150J102T
designator C?  Capacitance: 15pF  (hidden comment: *)
Capacitor, Ceramic (MLCC), 15pF, ±5%, 1kV, C0G, ±5%, SMD 1206; Manufacturer: IHHEC(HOLY STONE ENTERPRISE CO., LTD); Manufacturer Part Number: C1206N150J102T; Package Size: 1206; JLCPCB Basic Part: No; JLCPCB Part Number: C105971; Supplier 1: LCSC; Category: Capacitors - MLCC; Supplier Part Number 1: C105971; Tolerance: ±5%; Voltage Rating: 1kV; Temperature Coefficient: C0G; RoHS: Yes; ComponentLink1Description: Datasheet; ComponentLink1URL: https://wmsc.lcsc.com/wmsc/upload/file/pdf/v2/lcsc/2304140030_IHHEC-HOLY-STONE-ENTERPRISE-CO---LTD-C1206N150J102T_C105971.pdf; ComponentLink2Description: JLCPCB Part URL; ComponentLink2URL: https://jlcpcb.com/partdetail/C105971; ComponentLink3Description: LCSC Part URL; ComponentLink3URL: https://lcsc.com/product-detail/Multilayer-Ceramic-Capacitors-MLCC---SMD-SMT_IHHECHOLY-STONE-ENTERPRISE-CO.%2C-LTD-IHHECHOLY-STONE-ENTERPRISE-CO.%2C-LTD-C1206N150J102T_C105971.html
footprint CAP-1206 (1206 (3216M) Capacitor)
pins: 1, 2

## C1206N151J202TEF
designator C?  Capacitance: 150pF  (hidden comment: *)
Capacitor, Ceramic (MLCC), 150pF, ±5%, 2kV, NP0, ±5%, SMD 1206; Manufacturer: IHHEC(HOLY STONE ENTERPRISE CO., LTD); Manufacturer Part Number: C1206N151J202TEF; Package Size: 1206; JLCPCB Basic Part: No; JLCPCB Part Number: C915841; Supplier 1: LCSC; Category: Capacitors - MLCC; Supplier Part Number 1: C915841; Tolerance: ±5%; Voltage Rating: 2kV; Temperature Coefficient: NP0; RoHS: Yes; ComponentLink1Description: Datasheet; ComponentLink2Description: JLCPCB Part URL; ComponentLink2URL: https://jlcpcb.com/partdetail/C915841; ComponentLink3Description: LCSC Part URL; ComponentLink3URL: https://lcsc.com/product-detail/Multilayer-Ceramic-Capacitors-MLCC---SMD-SMT_IHHECHOLY-STONE-ENTERPRISE-CO.%2C-LTD-IHHECHOLY-STONE-ENTERPRISE-CO.%2C-LTD-C1206N151J202TEF_C915841.html
footprint CAP-1206 (1206 (3216M) Capacitor)
pins: 1, 2

## C1206N152J050T
designator C?  Capacitance: 1.5nF  (hidden comment: *)
Capacitor, Ceramic (MLCC), 1.5nF, ±5%, 50V, NP0, ±5%, SMD 1206; Manufacturer: IHHEC(HOLY STONE ENTERPRISE CO., LTD); Manufacturer Part Number: C1206N152J050T; Package Size: 1206; JLCPCB Basic Part: No; JLCPCB Part Number: C105972; Supplier 1: LCSC; Category: Capacitors - MLCC; Supplier Part Number 1: C105972; Tolerance: ±5%; Voltage Rating: 50V; Temperature Coefficient: NP0; RoHS: Yes; ComponentLink1Description: Datasheet; ComponentLink1URL: https://wmsc.lcsc.com/wmsc/upload/file/pdf/v2/lcsc/2304140030_IHHEC-HOLY-STONE-ENTERPRISE-CO---LTD-C1206N152J050T_C105972.pdf; ComponentLink2Description: JLCPCB Part URL; ComponentLink2URL: https://jlcpcb.com/partdetail/C105972; ComponentLink3Description: LCSC Part URL; ComponentLink3URL: https://lcsc.com/product-detail/Multilayer-Ceramic-Capacitors-MLCC---SMD-SMT_IHHECHOLY-STONE-ENTERPRISE-CO.%2C-LTD-IHHECHOLY-STONE-ENTERPRISE-CO.%2C-LTD-C1206N152J050T_C105972.html
footprint CAP-1206 (1206 (3216M) Capacitor)
pins: 1, 2

## C1206N152J251T
designator C?  Capacitance: 1.5nF  (hidden comment: *)
Capacitor, Ceramic (MLCC), 1.5nF, 250V, NP0, SMD 1206; Manufacturer: IHHEC(HOLY STONE ENTERPRISE CO., LTD); Manufacturer Part Number: C1206N152J251T; Package Size: 1206; JLCPCB Basic Part: No; JLCPCB Part Number: C2998556; Supplier 1: LCSC; Category: Capacitors - MLCC; Supplier Part Number 1: C2998556; Voltage Rating: 250V; Temperature Coefficient: NP0; RoHS: Yes; ComponentLink1Description: Datasheet; ComponentLink1URL: https://wmsc.lcsc.com/wmsc/upload/file/pdf/v2/lcsc/2205061616_IHHEC-HOLY-STONE-ENTERPRISE-CO---LTD-C1206N152J251T_C2998556.pdf; ComponentLink2Description: JLCPCB Part URL; ComponentLink2URL: https://jlcpcb.com/partdetail/C2998556; ComponentLink3Description: LCSC Part URL; ComponentLink3URL: https://lcsc.com/product-detail/Multilayer-Ceramic-Capacitors-MLCC---SMD-SMT_IHHECHOLY-STONE-ENTERPRISE-CO.%2C-LTD-IHHECHOLY-STONE-ENTERPRISE-CO.%2C-LTD-C1206N152J251T_C2998556.html
footprint CAP-1206 (1206 (3216M) Capacitor)
pins: 1, 2

## C1206N183K050T
designator C?  Capacitance: 18nF  (hidden comment: *)
Capacitor, Ceramic (MLCC), 18nF, ±10%, 50V, NP0, ±10%, SMD 1206; Manufacturer: IHHEC(HOLY STONE ENTERPRISE CO., LTD); Manufacturer Part Number: C1206N183K050T; Package Size: 1206; JLCPCB Basic Part: No; JLCPCB Part Number: C105974; Supplier 1: LCSC; Category: Capacitors - MLCC; Supplier Part Number 1: C105974; Tolerance: ±10%; Voltage Rating: 50V; Temperature Coefficient: NP0; RoHS: Yes; ComponentLink1Description: Datasheet; ComponentLink1URL: https://wmsc.lcsc.com/wmsc/upload/file/pdf/v2/lcsc/2304140030_IHHEC-HOLY-STONE-ENTERPRISE-CO---LTD-C1206N183K050T_C105974.pdf; ComponentLink2Description: JLCPCB Part URL; ComponentLink2URL: https://jlcpcb.com/partdetail/C105974; ComponentLink3Description: LCSC Part URL; ComponentLink3URL: https://lcsc.com/product-detail/Multilayer-Ceramic-Capacitors-MLCC---SMD-SMT_IHHECHOLY-STONE-ENTERPRISE-CO.%2C-LTD-IHHECHOLY-STONE-ENTERPRISE-CO.%2C-LTD-C1206N183K050T_C105974.html
footprint CAP-1206 (1206 (3216M) Capacitor)
pins: 1, 2

## C1206N220J050T
designator C?  Capacitance: 22pF  (hidden comment: *)
Capacitor, Ceramic (MLCC), 22pF, ±5%, 50V, NP0, ±5%, SMD 1206; Manufacturer: IHHEC(HOLY STONE ENTERPRISE CO., LTD); Manufacturer Part Number: C1206N220J050T; Package Size: 1206; JLCPCB Basic Part: No; JLCPCB Part Number: C2940742; Supplier 1: LCSC; Category: Capacitors - MLCC; Supplier Part Number 1: C2940742; Tolerance: ±5%; Voltage Rating: 50V; Temperature Coefficient: NP0; RoHS: Yes; ComponentLink1Description: Datasheet; ComponentLink1URL: https://wmsc.lcsc.com/wmsc/upload/file/pdf/v2/lcsc/2201121900_IHHEC-HOLY-STONE-ENTERPRISE-CO---LTD-C1206N220J050T_C2940742.pdf; ComponentLink2Description: JLCPCB Part URL; ComponentLink2URL: https://jlcpcb.com/partdetail/C2940742; ComponentLink3Description: LCSC Part URL; ComponentLink3URL: https://lcsc.com/product-detail/Multilayer-Ceramic-Capacitors-MLCC---SMD-SMT_IHHECHOLY-STONE-ENTERPRISE-CO.%2C-LTD-IHHECHOLY-STONE-ENTERPRISE-CO.%2C-LTD-C1206N220J050T_C2940742.html
footprint CAP-1206 (1206 (3216M) Capacitor)
pins: 1, 2
